# Altium footprint library LSCB.PcbLib: 64 footprints (part 2 of 4)
Each footprint in its own frame and in the unit in brackets; x right, y up, seen from the top. Pads: shape width x height; smd on the part's side, far side on the other; paste and mask are expansions set on the pad; w line width, h text height; cw(c..) or ccw(c..) is an arc to the next point about the centre after c.
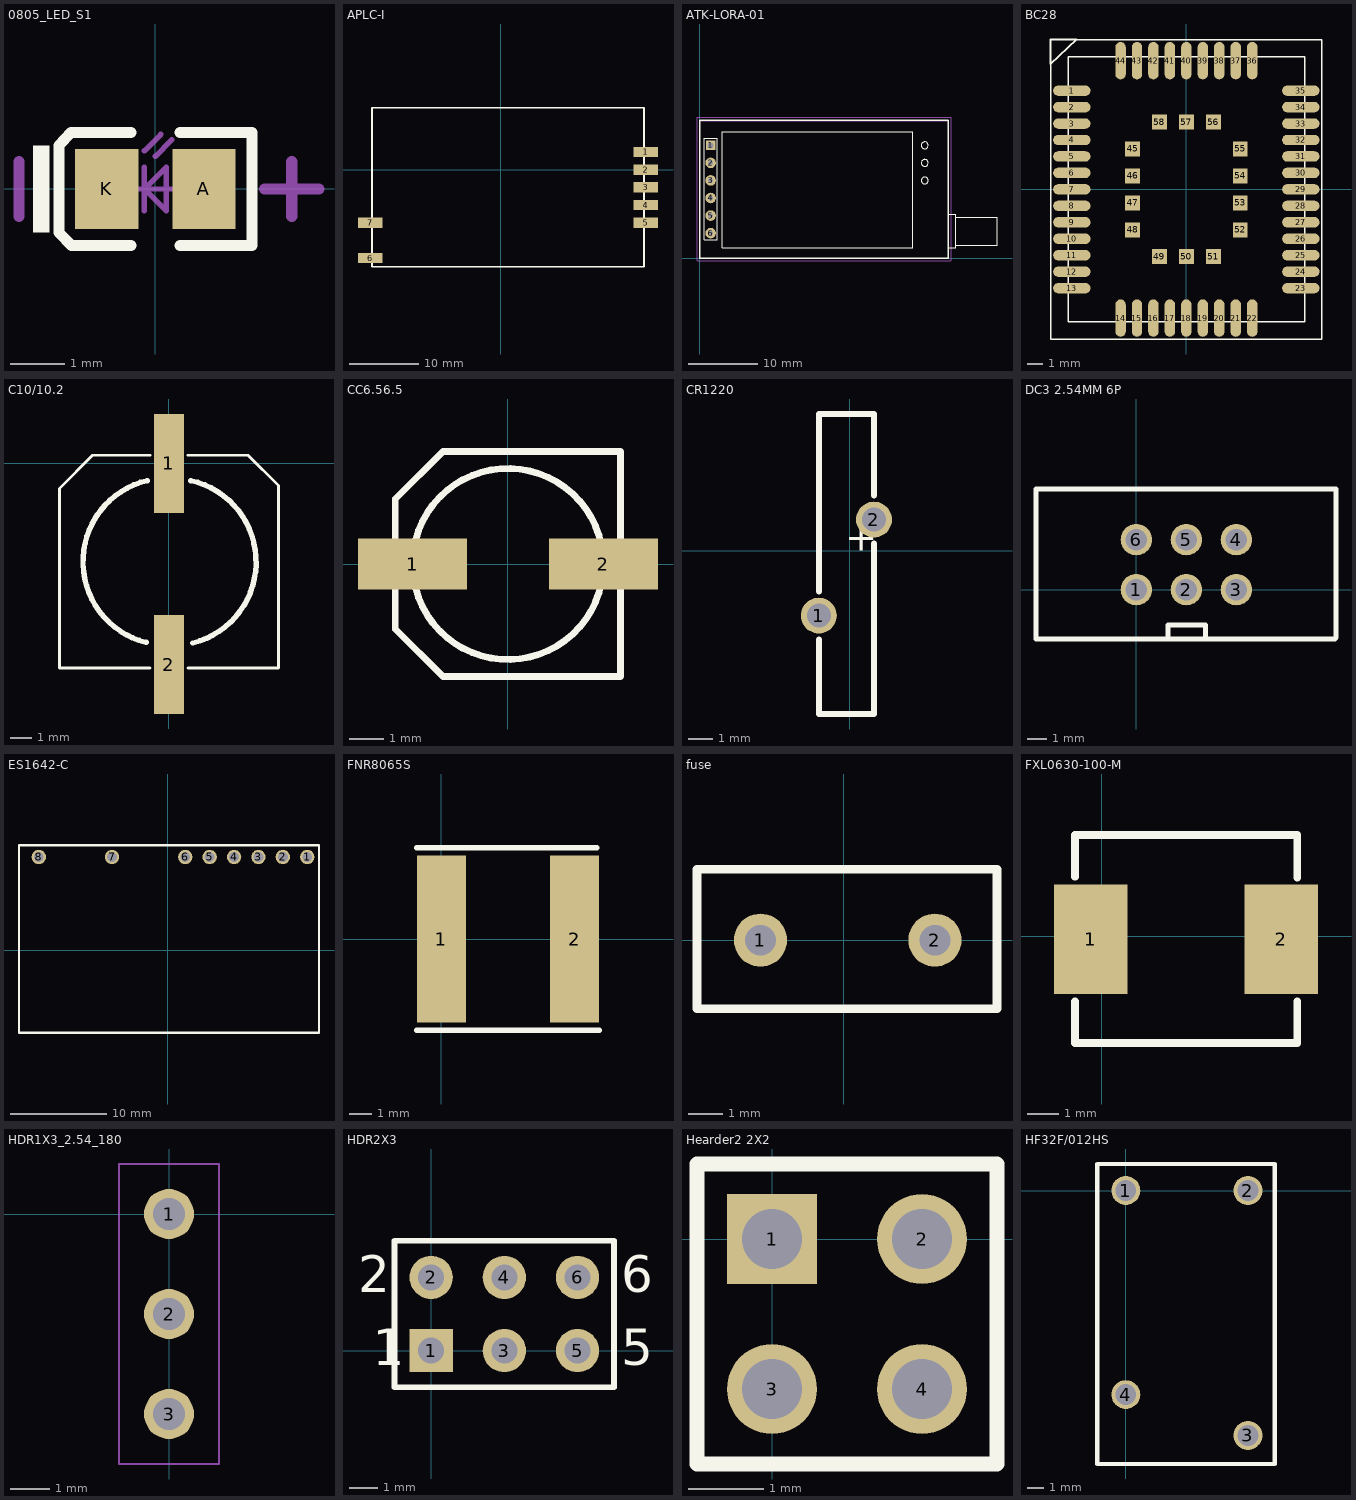
[diagram p1: the footprints below, top view; thin cyan lines are the x and y axes]

## 0805_LED_S1 [mm]
pads (2):
  rect 1.16x1.47 smd: A(0.89,0) K(-0.89,0)
Top Overlay:
  rectangle: -2.245,-0.8 -1.945,0.8
  lines w0.2: -0.45,-1.035 -1.535,-1.035 -1.77,-0.8 -1.77,0.8 -1.55,1.035 -0.45,1.035 ; 0.45,-1.035 1.77,-1.035 1.77,1.035 0.45,1.035
Mechanical 13:
  lines w0.1: -0.4,0 0.4,0 ; -0.2,-0.4 -0.2,0.4 ; -0.2,0.7 0.1,1 ; 0,0.6 0.3,0.9 ; -0.2,0 0.2,-0.4 0.2,0.4 -0.2,0
Mechanical 15:
  lines w0.203: -2.5,-0.5 -2.5,0.5 ; 2,0 3,0 ; 2.5,-0.5 2.5,0.5
3D body "User Library-led_0805.step": height 1.1, standoff 0, extent -1.01,-0.625 1.01,0.625

## APLC-I [mm]
pads (7):
  rect 3.5x1.5 smd: 1(20.828,2.54) 2(20.828,0) 3(20.828,-2.54) 4(20.828,-5.08) 5(20.828,-7.62) 6(-18.796,-12.7) 7(-18.796,-7.62)
Top Overlay:
  lines w0.254: -18.542,-13.97 -18.542,8.89 20.574,8.89 20.574,-13.97 -18.542,-13.97

## ATK-LORA-01 [mm]
pads (6):
  rect 1.4x1.4 hole 0.9: 1(1.59,16.35)
  round 1.524 hole 0.762: 2(1.59,13.81) 3(1.59,11.27) 4(1.59,8.73) 5(1.59,6.19) 6(1.59,3.65)
Top Overlay:
  circle w0.127: c32.59,16.35 r0.5
  circle w0.127: c32.59,11.27 r0.5
  circle w0.127: c32.59,13.81 r0.5
  lines w0.025: 3.429,1.524 30.861,1.524 30.861,2.54 30.861,18.288 3.302,18.288 3.302,1.524 3.683,1.524 ; 36,1.524 37.084,1.524 37.084,6.35 36,6.35 ; 37.084,1.905 38.608,1.905 43.053,1.905 43.053,5.969 38.608,5.969 37.084,5.969 ; 0.635,2.667 2.54,2.667 2.54,17.399 0.635,17.399 0.635,2.667
  lines w0.254: 0,0 36,0 36,20 0,20 0,0
Mechanical 1:
  lines w0.025: 0,19.939 35.941,19.939 ; 36.322,-0.381 -0.381,-0.381 -0.381,20.447 0,20.447 36.322,20.447 ; 36.449,-0.381 36.449,6.604 36.449,20.447
3D body: height 1, standoff 0, extent 1.191,15.92 1.988,16.719
3D body: height 0.25, standoff 0, extent 2.032,16.891 2.032,16.891
3D body: height 1, standoff 0, extent 1.191,13.38 1.988,14.179
3D body: height 1, standoff 0, extent 1.191,10.84 1.988,11.639
3D body: height 1, standoff 0, extent 1.191,8.3 1.988,9.099
3D body: height 1, standoff 0, extent 1.191,5.76 1.988,6.559
3D body: height 1, standoff 0, extent 1.191,3.22 1.988,4.019
3D body: height 3, standoff 2.6, extent 3.302,1.524 30.861,18.288
3D body: height 2.6, standoff 1, extent 0,-0.381 35.941,19.558
3D body: height 0.25, standoff 0, extent 32.004,16.891 32.004,16.891
3D body: height 4, standoff 0, extent 35.941,1.524 42.926,6.35

## BC28 [mm] "BC28 15.8X17.7mm H2.05mm RO"
height 2.05
pads (58):
  oval 2.5x0.7 smd paste+0 mask+0.05: 1(-7.65,6.6) 2(-7.65,5.5) 3(-7.65,4.4) 4(-7.65,3.3) 5(-7.65,2.2) 6(-7.65,1.1) 7(-7.65,0) 8(-7.65,-1.1) 9(-7.65,-2.2) 10(-7.65,-3.3) 11(-7.65,-4.4) 12(-7.65,-5.5) 13(-7.65,-6.6) 23(7.65,-6.6) 24(7.65,-5.5) 25(7.65,-4.4) 26(7.65,-3.3) 27(7.65,-2.2) 28(7.65,-1.1) 29(7.65,0) 30(7.65,1.1) 31(7.65,2.2) 32(7.65,3.3) 33(7.65,4.4) 34(7.65,5.5) 35(7.65,6.6)
  oval 0.7x2.5 smd paste+0 mask+0.05: 14(-4.4,-8.6) 15(-3.3,-8.6) 16(-2.2,-8.6) 17(-1.1,-8.6) 18(0,-8.6) 19(1.1,-8.6) 20(2.2,-8.6) 21(3.3,-8.6) 22(4.4,-8.6) 36(4.4,8.6) 37(3.3,8.6) 38(2.2,8.6) 39(1.1,8.6) 40(0,8.6) 41(-1.1,8.6) 42(-2.2,8.6) 43(-3.3,8.6) 44(-4.4,8.6)
  rect 1x1 smd mask+0.05: 45(-3.6,2.7) 46(-3.6,0.9) 47(-3.6,-0.9) 48(-3.6,-2.7) 49(-1.8,-4.5) 50(0,-4.5) 51(1.8,-4.5) 52(3.6,-2.7) 53(3.6,-0.9) 54(3.6,0.9) 55(3.6,2.7) 56(1.8,4.5) 57(0,4.5) 58(-1.8,4.5)
Top Overlay:
  lines w0.1: -9.1,8.352 -9.1,10.05 -7.339,10.05 -9.1,8.352 ; -9.05,-10 -9.05,10 9.05,10 9.05,-10 -9.05,-10 ; -7.9,-8.85 -7.9,8.85 7.9,8.85 7.9,-8.85 -7.9,-8.85

## C10/10.2 [mm]
pads (2):
  rect 1.4x4.6 smd: 1(0,0) 2(0,-9.363)
Top Overlay:
  lines w0.127: -0.889,-9.525 -5.1,-9.525 -5.1,-1.163 -3.556,0.381 -0.889,0.381 ; 0.889,-9.525 5.1,-9.525 5.1,-1.036 3.683,0.381 0.889,0.381
  lines w0.254: -1.067,-8.333 cw(c-0.127,-4.572) -1.008,-0.796 ; 1.016,-0.796 cw(c0.168,-4.588) 1.111,-8.358
3D body "1010.2CAP.SLDPRT": height 10.1, standoff 0, extent -5.174,-10.033 4.826,1.063

## CC6.56.5 [mm]
pads (2):
  rect 3.2x1.5 smd: 1(-2.794,0) 2(2.8,0)
Top Overlay:
  circle w0.2: c0,0 r2.8
  lines w0.2: -3.302,-1.905 -1.905,-3.302 3.302,-3.302 3.302,3.302 -1.905,3.302 -3.302,1.905 -3.302,-1.905
3D body "6.35.4cap.SLDPRT": height 6.52, standoff 0.12, extent -3.45,-3.158 3.45,3.142

## CR1220 [mm]
pads (2):
  round 1.5 hole 1: 1(-1.3,-2.7) 2(1,1.3)
Top Overlay:
  lines w0.254: -1.3,-3.7 -1.3,-6.8 1,-6.8 1,0.3 ; -1.3,-1.7 -1.3,5.7 1,5.7 1,2.3
  text "+" at -0.2,-0.4 h2

## DC3 2.54MM 6P [mm]
pads (6):
  round 1.6 hole 1.1: 1(0,0) 2(2.54,0) 3(5.08,0) 4(5.08,2.54) 5(2.54,2.54) 6(0,2.54)
Top Overlay:
  lines w0.254: 1.6,-2.5 1.6,-1.8 3.5,-1.8 3.5,-2.5 ; -5.1,-2.5 -5.1,5.1 10.14,5.1 10.14,-2.44 10.08,-2.5 -5.1,-2.5

## ES1642-C [mm]
pads (8):
  round 1.5 hole 1.02: 1(14.5,9.7) 2(11.96,9.7) 3(9.42,9.7) 4(6.88,9.7) 5(4.34,9.7) 6(1.8,9.7) 7(-5.82,9.7) 8(-13.44,9.7)
Top Overlay:
  lines w0.254: -15.5,-8.6 -15.5,10.93 15.72,10.93 15.72,-8.58 15.7,-8.6 -15.5,-8.6

## FNR8065S [mm] "长江微电封闭式功率电感"
pads (2):
  rect 2.2x7.5 smd: 1(0,0) 2(6,0)
Top Overlay:
  lines w0.254: -1.1,-4.1 7.1,-4.1 ; -1.1,4.1 7,4.1

## fuse [mm]
pads (2):
  round 1.524 hole 0.88: 1(-2.38,0) 2(2.62,0)
Top Overlay:
  lines w0.254: -4.2,-1.968 -4.2,2.032 4.4,2.032 4.4,-1.968 -4.2,-1.968
3D body "2A250V慢断.SLDPRT": height 7.21, standoff -2.99, extent -4.136,-1.968 4.264,2.032

## FXL0630-100-M [mm]
height 3
pads (2):
  rect 2.35x3.5 smd: 1(-0.355,-0.1) 2(5.72,-0.1)
Top Overlay:
  lines w0.254: -0.867,-2.075 -0.867,-3.4 6.233,-3.4 6.233,-2.075 ; -0.867,1.9 -0.867,3.226 6.233,3.226 6.233,1.875

## HDR1X3_2.54_180 [mil]
pads (3):
  round 50 hole 32: 1(0,0) 2(0,-100) 3(0,-200)
Mechanical 13:
  lines w2: -50,-250 -50,50 50,50 50,-250 -50,-250
Mechanical 14:
  lines w2: -50,-250 -50,50 50,50 50,-250 -50,-250
3D body "pin_header_aw140-eg-g03d.stp": height 322.83, standoff -118.11, extent -49.18,-250 49.18,50

## HDR2X3 [mm] "Connector; Header; 3x2 Position"
pads (6):
  rect 1.5x1.5 hole 0.9: 1(0,0)
  round 1.5 hole 0.9: 2(0,2.54) 3(2.54,0) 4(2.54,2.54) 5(5.08,0) 6(5.08,2.54)
Top Overlay:
  lines w0.2: 1.482,-1.27 6.35,-1.27 ; 6.35,-1.27 6.35,3.81 -1.27,3.81 -1.27,-1.27 6.35,-1.27
  text "6" at 6.604,2.032 h1.27
  text "5" at 6.604,-0.508 h1.27
  text "2" at -2.54,2.032 h1.27
  text "1" at -2.032,-0.508 h1.27
3D body "2.54 2x3p.SLDPRT": height 8.5, standoff -2.5, extent -1.256,-1.23 6.364,3.85

## Hearder2 2X2 [mm]
pads (4):
  rect 1.2x1.2 hole 0.8: 1(0,0)
  round 1.2 hole 0.8: 2(2,0) 3(0,-2) 4(2,-2)
Top Overlay:
  lines w0.2: -1,-3 -1,1 3,1 3,-3 -1,-3

## HF32F/012HS [mm]
pads (4):
  round 1.8 hole 1.3: 1(0,0) 2(7.6,0) 3(7.6,-15.24) 4(0,-12.7)
Top Overlay:
  lines w0.254: -1.778,-17.018 9.271,-17.018 9.271,1.651 -1.778,1.651 -1.778,-17.018
3D body "HF32F_2.SLDPRT": height 15.79, standoff -2.01, extent -1.353,-16.749 8.846,1.651
3D body: height 3.23, standoff -3.23, extent 2.413,1.651 2.413,1.651